# Altium footprint library 全库.PcbLib: 967 footprints (part 38 of 61)
Each footprint in its own frame and in the unit in brackets; x right, y up, seen from the top. Pads: shape width x height; smd on the part's side, far side on the other; paste and mask are expansions set on the pad; w line width, h text height; cw(c..) or ccw(c..) is an arc to the next point about the centre after c.
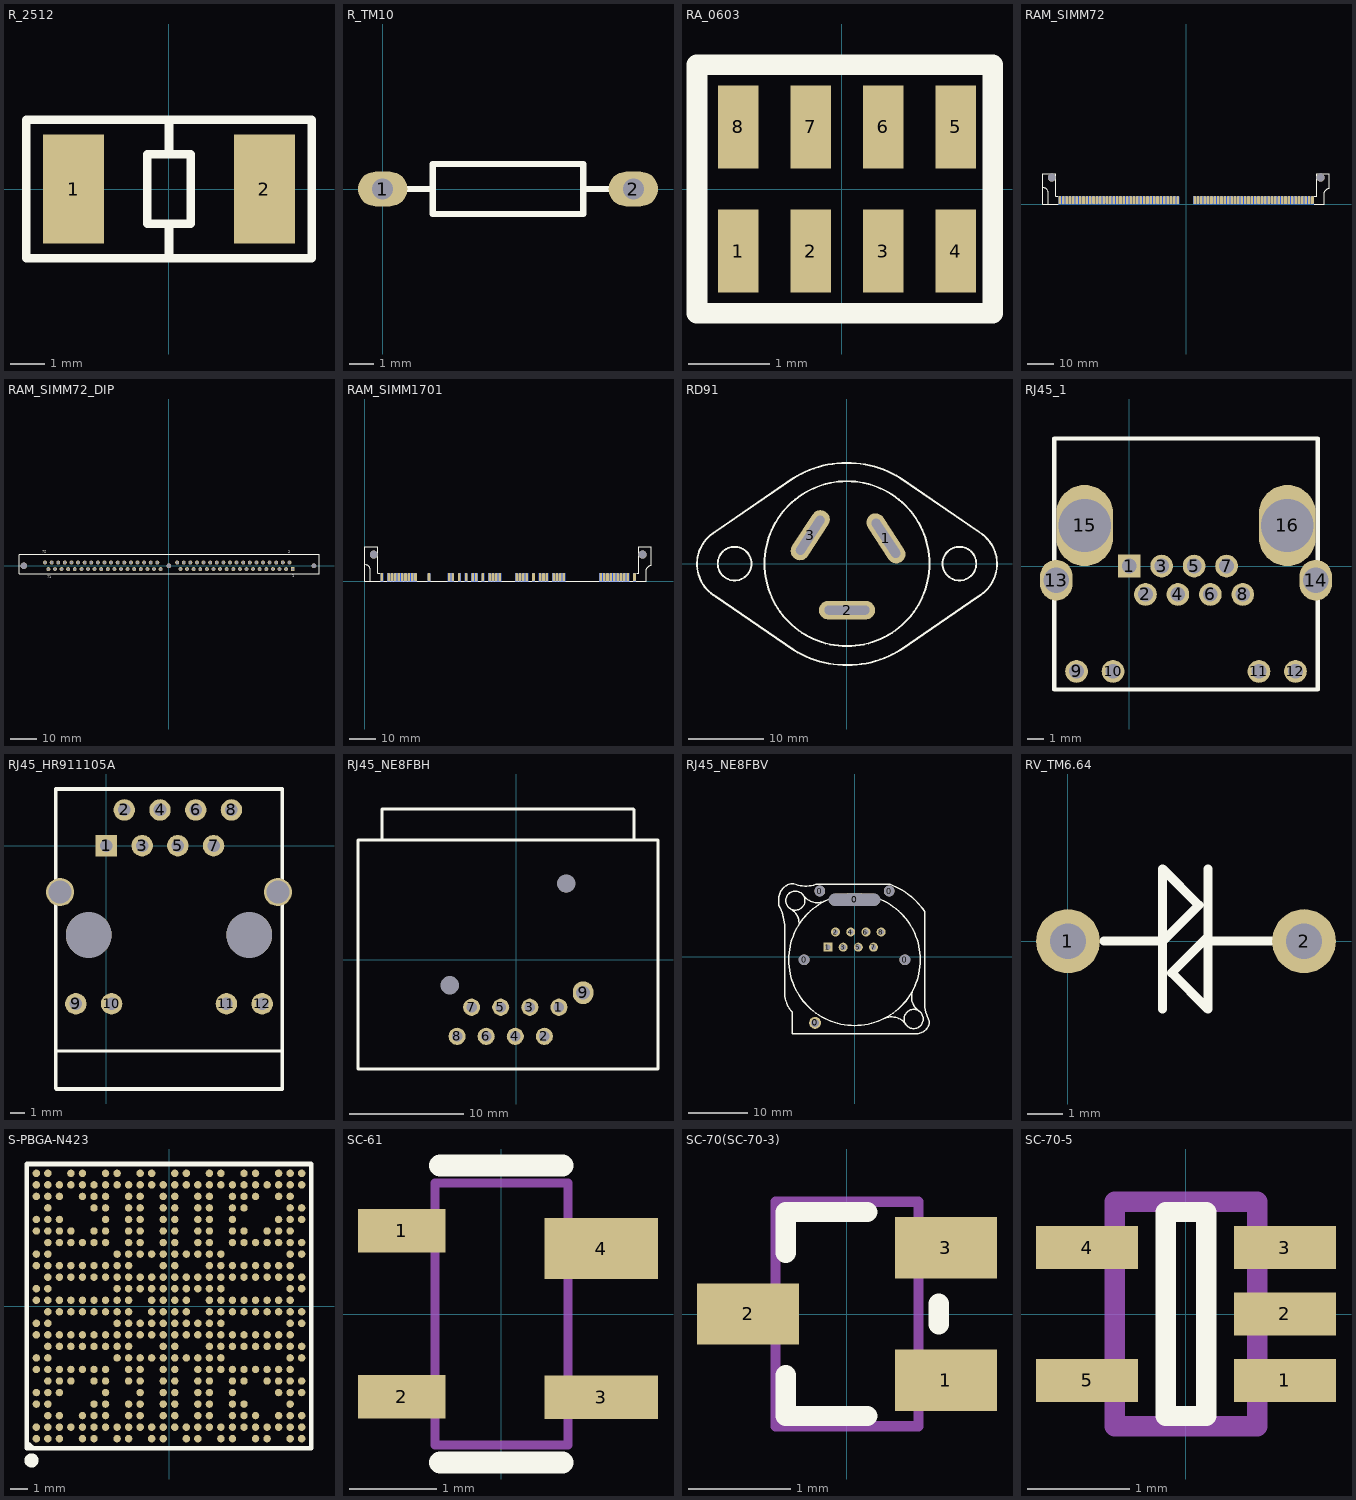
[diagram p37: the footprints below, top view; thin cyan lines are the x and y axes]

## R_2512 [mm] "Chip Resistor; Body 6.3 x 3.2 mm (LxW typ)"
height 0.6
pads (2):
  rect 1.8x3.2 smd: 1(-2.8,0) 2(2.8,0)
Top Overlay:
  lines w0.254: 0,-2.032 0,-1.016 ; 0,1.016 0,2.032 ; -4.191,-2.032 -4.191,2.032 4.191,2.032 4.191,-2.032 -4.191,-2.032 ; -0.635,-1.016 -0.635,1.016 0.635,1.016 0.635,-1.016 -0.635,-1.016

## R_TM10 [mm]
pads (2):
  oval 2x1.4 hole 0.85: 1(0,0) 2(10.16,0)
Top Overlay:
  lines w0.254: 1.016,0 2.032,0 ; 8.128,0 9.144,0 ; 2.032,-1.016 2.032,1.016 8.128,1.016 8.128,-1.016 2.032,-1.016

## RA_0603 [mil]
pads (8):
  rect 19.68x40 smd: 1(-50,-30) 2(-15,-30) 3(20,-30) 4(55,-30) 5(55,30) 6(20,30) 7(-15,30) 8(-50,30)
Top Overlay:
  lines w10: 71.01,-60 -69.99,-60 -69.99,60 73.01,60 73.01,-60

## RAM_SIMM72 [mm]
pads (146):
  rrect50% 1x3 smd: 1(47.636,1.538) 2(46.366,1.538) 3(45.096,1.538) 4(43.826,1.538) 5(42.556,1.538) 6(41.286,1.538) 7(40.016,1.538) 8(38.746,1.538) 9(37.476,1.538) 10(36.206,1.538) 11(34.936,1.538) 12(33.666,1.538) 13(32.396,1.538) 14(31.126,1.538) 15(29.856,1.538) 16(28.586,1.538) 17(27.316,1.538) 18(26.046,1.538) 19(24.776,1.538) 20(23.506,1.538) 21(22.236,1.538) 22(20.966,1.538) 23(19.696,1.538) 24(18.426,1.538) 25(17.156,1.538) 26(15.886,1.538) 27(14.616,1.538) 28(13.346,1.538) 29(12.076,1.538) 30(10.806,1.538) 31(9.536,1.538) 32(8.266,1.538) 33(6.996,1.538) 34(5.726,1.538) 35(4.456,1.538) 36(3.186,1.538) 37(-3.164,1.538) 38(-4.434,1.538) 39(-5.704,1.538) 40(-6.974,1.538) 41(-8.244,1.538) 42(-9.514,1.538) 43(-10.784,1.538) 44(-12.054,1.538) 45(-13.324,1.538) 46(-14.594,1.538) 47(-15.864,1.538) 48(-17.134,1.538) 49(-18.404,1.538) 50(-19.674,1.538) 51(-20.944,1.538) 52(-22.214,1.538) 53(-23.484,1.538) 54(-24.754,1.538) 55(-26.024,1.538) 56(-27.294,1.538) 57(-28.564,1.538) 58(-29.834,1.538) 59(-31.104,1.538) 60(-32.374,1.538) 61(-33.644,1.538) 62(-34.914,1.538) 63(-36.184,1.538) 64(-37.454,1.538) 65(-38.724,1.538) 66(-39.994,1.538) 67(-41.264,1.538) 68(-42.534,1.538) 69(-43.804,1.538) 70(-45.074,1.538) 71(-46.344,1.538) 72(-47.614,1.538)
  rrect50% 1x3 smd far side: 1(47.636,1.538) 2(46.366,1.538) 3(45.096,1.538) 4(43.826,1.538) 5(42.556,1.538) 6(41.286,1.538) 7(40.016,1.538) 8(38.746,1.538) 9(37.476,1.538) 10(36.206,1.538) 11(34.936,1.538) 12(33.666,1.538) 13(32.396,1.538) 14(31.126,1.538) 15(29.856,1.538) 16(28.586,1.538) 17(27.316,1.538) 18(26.046,1.538) 19(24.776,1.538) 20(23.506,1.538) 21(22.236,1.538) 22(20.966,1.538) 23(19.696,1.538) 24(18.426,1.538) 25(17.156,1.538) 26(15.886,1.538) 27(14.616,1.538) 28(13.346,1.538) 29(12.076,1.538) 30(10.806,1.538) 31(9.536,1.538) 32(8.266,1.538) 33(6.996,1.538) 34(5.726,1.538) 35(4.456,1.538) 36(3.186,1.538) 37(-3.164,1.538) 38(-4.434,1.538) 39(-5.704,1.538) 40(-6.974,1.538) 41(-8.244,1.538) 42(-9.514,1.538) 43(-10.784,1.538) 44(-12.054,1.538) 45(-13.324,1.538) 46(-14.594,1.538) 47(-15.864,1.538) 48(-17.134,1.538) 49(-18.404,1.538) 50(-19.674,1.538) 51(-20.944,1.538) 52(-22.214,1.538) 53(-23.484,1.538) 54(-24.754,1.538) 55(-26.024,1.538) 56(-27.294,1.538) 57(-28.564,1.538) 58(-29.834,1.538) 59(-31.104,1.538) 60(-32.374,1.538) 61(-33.644,1.538) 62(-34.914,1.538) 63(-36.184,1.538) 64(-37.454,1.538) 65(-38.724,1.538) 66(-39.994,1.538) 67(-41.264,1.538) 68(-42.534,1.538) 69(-43.804,1.538) 70(-45.074,1.538) 71(-46.344,1.538) 72(-47.614,1.538)
  round 3 hole 3: ""(-50.689,10.038) ""(50.711,10.038)
Top Overlay:
  lines w0.254: -53.993,6.303 cw(c-54.286,3.979) -51.989,4.438 -51.989,0.638 -51.989,-0.062 ; -48.2,-0.062 -53.989,-0.062 -53.989,4.738 -53.989,11.43 -49.089,11.43 -49.089,3.038 -48.189,3.038 ; 48.3,-0.062 52.011,-0.062 52.011,0.638 52.011,4.438 cw(c54.178,3.547) 54.008,5.884 ; 48.3,3.038 49.211,3.038 49.211,11.557 54.011,11.557 54.011,5.938

## RAM_SIMM72_DIP [mm] "SIMM SOKET PITCH 1.27mm"
pads (75):
  rect 1.524x1.524 hole 1: 1(47.625,-1.275)
  round 1.524 hole 1: 2(46.345,1.265) 3(45.085,-1.275) 4(43.815,1.275) 5(42.545,-1.275) 6(41.275,1.265) 7(40.005,-1.275) 8(38.735,1.265) 9(37.465,-1.275) 10(36.195,1.265) 11(34.925,-1.275) 12(33.655,1.265) 13(32.385,-1.275) 14(31.115,1.265) 15(29.845,-1.275) 16(28.575,1.265) 17(27.305,-1.275) 18(26.035,1.265) 19(24.765,-1.275) 20(23.495,1.265) 21(22.225,-1.275) 22(20.955,1.265) 23(19.685,-1.275) 24(18.415,1.265) 25(17.145,-1.275) 26(15.875,1.265) 27(14.605,-1.275) 28(13.335,1.265) 29(12.065,-1.275) 30(10.795,1.27) 31(9.525,-1.275) 32(8.255,1.265) 33(6.985,-1.275) 34(5.715,1.265) 35(4.445,-1.265) 36(3.175,1.265) 37(-3.175,-1.275) 38(-4.445,1.265) 39(-5.715,-1.275) 40(-6.985,1.265) 41(-8.255,-1.275) 42(-9.525,1.265) 43(-10.795,-1.275) 44(-12.065,1.265) 45(-13.335,-1.275) 46(-14.605,1.265) 47(-15.875,-1.275) 48(-17.145,1.265) 49(-18.415,-1.275) 50(-19.685,1.265) 51(-20.955,-1.275) 52(-22.225,1.265) 53(-23.495,-1.275) 54(-24.765,1.265) 55(-26.035,-1.275) 56(-27.305,1.265) 57(-28.575,-1.275) 58(-29.845,1.265) 59(-31.115,-1.275) 60(-32.385,1.265) 61(-33.575,-1.275) 62(-34.925,1.265) 64(-37.465,1.265) 66(-40.005,1.265) 67(-41.275,-1.275) 68(-42.545,1.265) 69(-43.815,-1.275) 70(-45.085,1.265) 71(-46.355,-1.275) 72(-47.625,1.265)
  round 1.524 hole 1 paste+0: 63(-36.195,-1.275) 65(-38.735,-1.275)
  round 2.5 hole 2.5: ""(-55.78,-0.005)
  round 1.8 hole 1.8: ""(0,-0.005) ""(55.78,-0.005)
Top Overlay:
  lines w0.254: -57.64,-2.99 -57.64,4.325 ; -57.64,4.345 57.725,4.345 57.725,-2.995 ; -57.625,-3.005 53.065,-3.005 57.725,-3.005
  text "1" at 47.498,-4.318 h1
  text "2" at 45.974,4.826 h1
  text "72" at -48.641,5.08 h1
  text "71" at -46.863,-4.699 h1

## RAM_SIMM1701 [mm]
pads (126):
  rrect50% 1x3 smd: 1(101.625,1.65) 3(99.085,1.65) 4(97.815,1.65) 5(96.545,1.65) 6(95.275,1.65) 7(94.005,1.65) 8(92.735,1.65) 9(91.465,1.65) 10(90.195,1.65) 11(88.925,1.65) 22(74.955,1.65) 23(73.685,1.65) 24(72.415,1.65) 25(71.145,1.65) 27(68.605,1.65) 28(67.335,1.65) 29(66.065,1.65) 31(63.525,1.65) 33(60.985,1.65) 34(59.715,1.65) 35(58.445,1.65) 36(57.175,1.65) 37(50.825,1.65) 38(49.555,1.65) 39(48.285,1.65) 40(47.015,1.65) 42(44.475,1.65) 44(41.935,1.65) 45(40.665,1.65) 47(38.125,1.65) 49(35.585,1.65) 51(33.045,1.65) 52(31.775,1.65) 58(24.155,1.65) 62(19.075,1.65) 63(17.805,1.65) 64(16.535,1.65) 65(15.265,1.65) 66(13.995,1.65) 67(12.725,1.65) 68(11.455,1.65) 69(10.185,1.65) 70(8.915,1.65) 72(6.375,1.65)
  rrect0% 1x3 smd far side: 1(101.625,1.65) 3(99.085,1.65) 4(97.815,1.65) 5(96.545,1.65) 6(95.275,1.65) 7(94.005,1.65) 8(92.735,1.65) 9(91.465,1.65) 10(90.195,1.65) 11(88.925,1.65) 22(74.955,1.65) 23(73.685,1.65) 24(72.415,1.65) 25(71.145,1.65) 27(68.605,1.65) 28(67.335,1.65) 29(66.065,1.65) 31(63.525,1.65) 33(60.985,1.65) 34(59.715,1.65) 35(58.445,1.65) 36(57.175,1.65) 37(50.825,1.65) 38(49.555,1.65) 39(48.285,1.65) 40(47.015,1.65) 42(44.475,1.65) 44(41.935,1.65) 45(40.665,1.65) 47(38.125,1.65) 49(35.585,1.65) 51(33.045,1.65) 52(31.775,1.65) 58(24.155,1.65) 62(19.075,1.65) 63(17.805,1.65) 64(16.535,1.65) 65(15.265,1.65) 66(13.995,1.65) 67(12.725,1.65) 68(11.455,1.65) 69(10.185,1.65) 70(8.915,1.65) 72(6.375,1.65)
  rrect50% 0x0 smd: 2(100.355,1.65) 12(87.655,1.65) 13(86.385,1.65) 14(85.115,1.65) 15(83.845,1.65) 16(82.575,1.65) 17(81.305,1.65) 18(80.035,1.65) 19(78.765,1.65) 20(77.495,1.65) 21(76.225,1.65) 26(69.875,1.65) 30(64.795,1.65) 32(62.255,1.65) 41(45.745,1.65) 43(43.205,1.65) 46(39.395,1.65) 48(36.855,1.65) 50(34.315,1.65) 53(30.505,1.65) 54(29.235,1.65) 55(27.965,1.65) 56(26.695,1.65) 57(25.425,1.65) 59(22.885,1.65) 60(21.615,1.65) 61(20.345,1.65) 71(7.645,1.65)
  rrect0% 0x0 smd far side: 54(29.235,1.65) 55(27.965,1.65) 56(26.695,1.65) 57(25.425,1.65) 59(22.885,1.65) 60(21.615,1.65) 61(20.345,1.65) 71(7.645,1.65)
  round 3 hole 3: ""(3.3,10.15) ""(104.7,10.15)
Top Overlay:
  lines w0.1: -0.004,6.415 cw(c-0.297,4.091) 2,4.55 ; 106,4.55 cw(c108.166,3.659) 107.997,5.995
  lines w0.254: 2,0.05 2,0.75 2,4.55 ; 5.8,3.15 4.9,3.15 4.9,10.15 4.9,13.15 0.3,13.15 0,13.15 0,4.85 0,0.05 3.5,0.05 98.9,0.05 ; 98.8,0.05 106,0.05 106,0.75 106,4.55 ; 102.5,3.15 103.2,3.15 103.2,10.15 103.2,13.05 103.3,13.15 104.7,13.15 ; 104.6,13.15 108,13.15 108,6.05

## RD91 [mm]
pads (3):
  oval 7.5x2.5 hole 1.2 slot 6 at 123 deg rot 123: 1(5.2,3.38)
  oval 7.5x2.5 hole 1.2 slot 6 at 0 deg: 2(0,-6.2)
  oval 7.5x2.5 hole 1.2 slot 6 at 57 deg rot 57: 3(-4.9,3.8)
Top Overlay:
  circle w0.254: c15,0 r2.25
  circle w0.254: c-15,0 r2.25
  circle w0.254: c0,0 r11
  lines w0.254: -17.599,4.245 ccw(c-15,-0.043) -17.502,-4.389 -7.123,-11.514 ccw(c0,-0.043) 7.234,-11.444 17.522,-4.378 ccw(c15,-0.043) 17.56,4.268 7.123,11.427 ccw(c0,-0.043) -7.234,11.357 -17.599,4.245

## RJ45_1 [mil]
pads (16):
  rect 56x56 hole 36: 1(0,0)
  round 56 hole 36: 2(40,-70) 3(80,0) 4(120,-70) 5(160,0) 6(200,-70) 7(240,0) 8(280,-70) 9(-130,-260) 10(-40,-260) 11(320,-260) 12(410,-260)
  oval 80x100 hole 63: 13(-180,-35) 14(460,-35)
  oval 140x200 hole 130: 15(-110,100) 16(390,100)
Top Overlay:
  lines w10: -185,-305 465,-305 465,315 -185,315 -185,-305

## RJ45_HR911105A [mm]
pads (16):
  rect 1.524x1.524 hole 0.89: 1(0,0)
  round 1.524 hole 0.89: 2(1.27,2.54) 3(2.54,0) 4(3.81,2.54) 5(5.08,0) 6(6.35,2.54) 7(7.62,0) 8(8.89,2.54) 9(-2.175,-11.25) 10(0.365,-11.25) 11(8.535,-11.25) 12(11.075,-11.25)
  round 2 hole 1.63: ""(-3.295,-3.3) ""(12.195,-3.3)
  round 3.25 hole 3.25: ""(-1.265,-6.35) ""(10.165,-6.35)
Top Overlay:
  lines w0.2: -3.6,-14.605 12.5,-14.605
  lines w0.254: 12.5,-17.309 -3.561,-17.309 -3.6,-17.27 -3.6,-12.058 -3.6,4.03 12.5,4.03 12.5,-17.27

## RJ45_NE8FBH [mm] "neutrik 网络插座"
pads (11):
  round 1.5 hole 0.9: 1(3.705,-4.13) 2(2.435,-6.67) 3(1.165,-4.13) 4(-0.105,-6.67) 5(-1.375,-4.13) 6(-2.645,-6.67) 7(-3.915,-4.13) 8(-5.185,-6.67)
  oval 1.8x2 hole 1.2: 9(5.82,-2.86)
  round 1.55 hole 1.6 unplated: ""(-5.82,-2.22) ""(4.34,6.67)
Top Overlay:
  lines w0.254: -11.74,10.48 -11.74,13.18 ; -11.64,13.18 10.21,13.18 10.26,13.13 10.26,12.03 ; -4.09,10.48 -13.84,10.48 -13.84,-9.52 12.36,-9.52 12.36,10.43 ; -4.08,10.48 -0.74,10.48 6.85,10.48 ; 6.86,10.48 12.36,10.48 ; 10.26,10.48 10.26,12.08

## RJ45_NE8FBV [mm] "neutrik 网络插座"
pads (14):
  round 1.8 hole 1.8: 0(-8.425,-0.475) 0(-5.8,11.025) 0(5.8,11.025) 0(8.425,-0.475)
  round 2 hole 1.3: 0(-6.6,-11.025)
  oval 8.6x2 hole 2 slot 8.6 at 0 deg: 0(0,9.575)
  rect 1.5x1.5 hole 0.9: 1(-4.44,1.635)
  round 1.5 hole 0.9: 2(-3.17,4.175) 3(-1.9,1.635) 4(-0.63,4.175) 5(0.64,1.635) 6(1.91,4.175) 7(3.18,1.635) 8(4.45,4.175)
Top Overlay:
  circle w0.254: c0,-0.475 r11
  circle w0.254: c-9.9,9.425 r1.6
  circle w0.254: c9.9,-10.375 r1.6
  lines w0.254: -12.66,8.576 -12.66,9.76 cw(c-10.16,9.76) -10.16,12.26 ccw(c-8.17,16.847) -6.489,12.138 5.942,12.138 cw(c1.784,0.882) 11.73,7.595 11.73,-7.681 ccw(c17.781,-7.681) 12.526,-10.681 cw(c10.367,-10.681) 10.163,-12.831 -10.434,-12.831 ; -12.648,8.576 cw(c-19.013,4.942) -11.684,4.942 -11.684,-5.901 ccw(c-6.684,-5.901) -10.434,-9.208 -10.434,-12.833 ; -10.823,8.13 cw(c-12.162,5.546) -9.254,5.443 ; -8.661,10.447 ccw(c-6.19,11.984) -4.851,9.401 ; 4.846,-10.344 cw(c6.186,-12.928) 8.56,-11.245 ; 9.881,-5.301 ccw(c12.454,-6.66) 10.924,-9.136

## RV_TM6.64 [mm]
pads (2):
  round 1.8 hole 1: 1(0,0) 2(6.64,0)
Top Overlay:
  lines w0.254: 1.016,0 2.662,0 ; 2.665,-1.905 2.665,-0.002 ; 3.681,1.016 2.665,2.032 2.665,-0.002 ; 3.682,1.015 2.665,-0.002 ; 3.935,0 5.715,0 ; 3.935,0.125 2.919,-0.891 3.935,-1.907 3.935,2.032

## S-PBGA-N423 [mm]
pads (424):
  round 0.42 smd mask+0.051: A1(-7.475,-7.475) A2(-7.475,-6.825) A4(-7.475,-5.525) A5(-7.475,-4.875) A7(-7.475,-3.575) A8(-7.475,-2.925) A10(-7.475,-1.625) A11(-7.475,-0.975) A13(-7.475,0.325) A14(-7.475,0.975) A16(-7.475,2.275) A17(-7.475,2.925) A19(-7.475,4.225) A20(-7.475,4.875) A22(-7.475,6.175) A23(-7.475,6.825) A24(-7.475,7.475) AA1(5.525,-7.475) AA2(5.525,-6.825) AA6(5.525,-4.225) AA7(5.525,-3.575) AA9(5.525,-2.275) AA10(5.525,-1.625) AA12(5.525,-0.325) AA13(5.525,0.325) AA15(5.525,1.625) AA16(5.525,2.275) AA18(5.525,3.575) AA19(5.525,4.225) AA23(5.525,6.825) AB2(6.175,-6.825) AB3(6.175,-6.175) AB5(6.175,-4.875) AB6(6.175,-4.225) AB7(6.175,-3.575) AB9(6.175,-2.275) AB10(6.175,-1.625) AB12(6.175,-0.325) AB13(6.175,0.325) AB15(6.175,1.625) AB16(6.175,2.275) AB18(6.175,3.575) AB19(6.175,4.225) AB20(6.175,4.875) AB22(6.175,6.175) AB23(6.175,6.825) AB24(6.175,7.475) AC1(6.825,-7.475) AC2(6.825,-6.825) AC3(6.825,-6.175) AC4(6.825,-5.525) AC5(6.825,-4.875) AC6(6.825,-4.225) AC7(6.825,-3.575) AC8(6.825,-2.925) AC9(6.825,-2.275) AC10(6.825,-1.625) AC11(6.825,-0.975) AC12(6.825,-0.325) AC13(6.825,0.325) AC14(6.825,0.975) AC15(6.825,1.625) AC16(6.825,2.275) AC17(6.825,2.925) AC18(6.825,3.575) AC19(6.825,4.225) AC20(6.825,4.875) AC21(6.825,5.525) AC22(6.825,6.175) AC23(6.825,6.825) AC24(6.825,7.475) AD1(7.475,-7.475) AD2(7.475,-6.825) AD3(7.475,-6.175) AD5(7.475,-4.875) AD6(7.475,-4.225) AD8(7.475,-2.925) AD9(7.475,-2.275) AD11(7.475,-0.975) AD12(7.475,-0.325) AD14(7.475,0.975) AD15(7.475,1.625) AD17(7.475,2.925) AD18(7.475,3.575) AD20(7.475,4.875) AD21(7.475,5.525) AD23(7.475,6.825) AD24(7.475,7.475) B1(-6.825,-7.475) B2(-6.825,-6.825) B3(-6.825,-6.175) B4(-6.825,-5.525) B5(-6.825,-4.875) B6(-6.825,-4.225) B7(-6.825,-3.575) B8(-6.825,-2.925) B9(-6.825,-2.275) B10(-6.825,-1.625) B11(-6.825,-0.975) B12(-6.825,-0.325) B13(-6.825,0.325) B14(-6.825,0.975) B15(-6.825,1.625) B16(-6.825,2.275) B17(-6.825,2.925) B18(-6.825,3.575) B19(-6.825,4.225) B20(-6.825,4.875) B21(-6.825,5.525) B22(-6.825,6.175) B23(-6.825,6.825) B24(-6.825,7.475) C1(-6.175,-7.475) C2(-6.175,-6.825) C3(-6.175,-6.175) C5(-6.175,-4.875) C6(-6.175,-4.225) C7(-6.175,-3.575) C9(-6.175,-2.275) C10(-6.175,-1.625) C12(-6.175,-0.325) C13(-6.175,0.325) C15(-6.175,1.625) C16(-6.175,2.275) C18(-6.175,3.575) C19(-6.175,4.225) C20(-6.175,4.875) C22(-6.175,6.175) C23(-6.175,6.825) D2(-5.525,-6.825) D6(-5.525,-4.225) D7(-5.525,-3.575) D9(-5.525,-2.275) D10(-5.525,-1.625) D12(-5.525,-0.325) D13(-5.525,0.325) D15(-5.525,1.625) D16(-5.525,2.275) D18(-5.525,3.575) D19(-5.525,4.225) D23(-5.525,6.825) D24(-5.525,7.475) E1(-4.875,-7.475) E2(-4.875,-6.825) E3(-4.875,-6.175) E7(-4.875,-3.575) E9(-4.875,-2.275) E10(-4.875,-1.625) E12(-4.875,-0.325) E13(-4.875,0.325) E15(-4.875,1.625) E16(-4.875,2.275) E18(-4.875,3.575) E22(-4.875,6.175) E23(-4.875,6.825) E24(-4.875,7.475) F1(-4.225,-7.475) F2(-4.225,-6.825) F3(-4.225,-6.175) F4(-4.225,-5.525) F6(-4.225,-4.225) F7(-4.225,-3.575) F9(-4.225,-2.275) F10(-4.225,-1.625) F12(-4.225,-0.325) F13(-4.225,0.325) F15(-4.225,1.625) F16(-4.225,2.275) F18(-4.225,3.575) F19(-4.225,4.225) F21(-4.225,5.525) F22(-4.225,6.175) F23(-4.225,6.825) G2(-3.575,-6.825) G3(-3.575,-6.175) G4(-3.575,-5.525) G5(-3.575,-4.875) G6(-3.575,-4.225) G7(-3.575,-3.575) G9(-3.575,-2.275) G10(-3.575,-1.625) G12(-3.575,-0.325) G13(-3.575,0.325) G15(-3.575,1.625) G16(-3.575,2.275) G18(-3.575,3.575) G19(-3.575,4.225) G20(-3.575,4.875) G21(-3.575,5.525) G22(-3.575,6.175) G23(-3.575,6.825) G24(-3.575,7.475) H1(-2.925,-7.475) H2(-2.925,-6.825) H8(-2.925,-2.925) H9(-2.925,-2.275) H10(-2.925,-1.625) H11(-2.925,-0.975) H12(-2.925,-0.325) H13(-2.925,0.325) H14(-2.925,0.975) H15(-2.925,1.625) H16(-2.925,2.275) H17(-2.925,2.925) H23(-2.925,6.825) H24(-2.925,7.475) J1(-2.275,-7.475) J2(-2.275,-6.825) J3(-2.275,-6.175) J4(-2.275,-5.525) J6(-2.275,-4.225) J7(-2.275,-3.575) J8(-2.275,-2.925) J9(-2.275,-2.275) J10(-2.275,-1.625) J11(-2.275,-0.975) J12(-2.275,-0.325) J13(-2.275,0.325) J14(-2.275,0.975) J15(-2.275,1.625) J16(-2.275,2.275) J17(-2.275,2.925) J18(-2.275,3.575) J19(-2.275,4.225) J20(-2.275,4.875) J21(-2.275,5.525) J22(-2.275,6.175) J23(-2.275,6.825) K2(-1.625,-6.825) K3(-1.625,-6.175) K4(-1.625,-5.525) K5(-1.625,-4.875) K6(-1.625,-4.225) K7(-1.625,-3.575) K8(-1.625,-2.925) K10(-1.625,-1.625) K11(-1.625,-0.975) K14(-1.625,0.975) K15(-1.625,1.625) K17(-1.625,2.925) K18(-1.625,3.575) K19(-1.625,4.225) K20(-1.625,4.875) K21(-1.625,5.525) K22(-1.625,6.175) K23(-1.625,6.825) K24(-1.625,7.475) L1(-0.975,-7.475) L2(-0.975,-6.825) L8(-0.975,-2.925) L10(-0.975,-1.625) L11(-0.975,-0.975) L12(-0.975,-0.325) L13(-0.975,0.325) L14(-0.975,0.975) L15(-0.975,1.625) L17(-0.975,2.925) L23(-0.975,6.825) L24(-0.975,7.475) M1(-0.325,-7.475) M2(-0.325,-6.825) M3(-0.325,-6.175) M4(-0.325,-5.525) M5(-0.325,-4.875) M6(-0.325,-4.225) M7(-0.325,-3.575) M8(-0.325,-2.925) M9(-0.325,-2.275) M10(-0.325,-1.625) M11(-0.325,-0.975) M12(-0.325,-0.325) M13(-0.325,0.325) M14(-0.325,0.975) M15(-0.325,1.625) M16(-0.325,2.275) M17(-0.325,2.925) M18(-0.325,3.575) M19(-0.325,4.225) M20(-0.325,4.875) M21(-0.325,5.525) M22(-0.325,6.175) M23(-0.325,6.825) N2(0.325,-6.825) N3(0.325,-6.175) N4(0.325,-5.525) N5(0.325,-4.875) N6(0.325,-4.225) N7(0.325,-3.575) N8(0.325,-2.925) N9(0.325,-2.275) N10(0.325,-1.625) N11(0.325,-0.975) N12(0.325,-0.325) N13(0.325,0.325) N14(0.325,0.975) N15(0.325,1.625) N16(0.325,2.275) N17(0.325,2.925) N18(0.325,3.575) N19(0.325,4.225) N20(0.325,4.875) N21(0.325,5.525) N22(0.325,6.175) N23(0.325,6.825) N24(0.325,7.475) P1(0.975,-7.475) P2(0.975,-6.825) P8(0.975,-2.925) P10(0.975,-1.625) P11(0.975,-0.975) P12(0.975,-0.325) P13(0.975,0.325) P14(0.975,0.975) P15(0.975,1.625) P17(0.975,2.925) P23(0.975,6.825) P24(0.975,7.475) R1(1.625,-7.475) R2(1.625,-6.825) R3(1.625,-6.175) R4(1.625,-5.525) R5(1.625,-4.875) R6(1.625,-4.225) R7(1.625,-3.575) R8(1.625,-2.925) R10(1.625,-1.625) R11(1.625,-0.975) R14(1.625,0.975) R15(1.625,1.625) R17(1.625,2.925) R18(1.625,3.575) R19(1.625,4.225) R20(1.625,4.875) R21(1.625,5.525) R22(1.625,6.175) R23(1.625,6.825) T2(2.275,-6.825) T3(2.275,-6.175) T4(2.275,-5.525) T5(2.275,-4.875) T6(2.275,-4.225) T7(2.275,-3.575) T8(2.275,-2.925) T9(2.275,-2.275) T10(2.275,-1.625) T11(2.275,-0.975) T12(2.275,-0.325) T13(2.275,0.325) T14(2.275,0.975) T15(2.275,1.625) T16(2.275,2.275) T17(2.275,2.925) T18(2.275,3.575) T19(2.275,4.225) T20(2.275,4.875) T21(2.275,5.525) T22(2.275,6.175) T23(2.275,6.825) T24(2.275,7.475) U1(2.925,-7.475) U2(2.925,-6.825) U7(2.925,-3.575) U8(2.925,-2.925) U9(2.925,-2.275) U10(2.925,-1.625) U11(2.925,-0.975) U12(2.925,-0.325) U13(2.925,0.325) U14(2.925,0.975) U15(2.925,1.625) U16(2.925,2.275) U17(2.925,2.925) U23(2.925,6.825) U24(2.925,7.475) V1(3.575,-7.475) V2(3.575,-6.825) V3(3.575,-6.175) V4(3.575,-5.525) V5(3.575,-4.875) V6(3.575,-4.225) V7(3.575,-3.575) V9(3.575,-2.275) V10(3.575,-1.625) V12(3.575,-0.325) V13(3.575,0.325) V15(3.575,1.625) V16(3.575,2.275) V18(3.575,3.575) V19(3.575,4.225) V20(3.575,4.875) V21(3.575,5.525) V22(3.575,6.175) V23(3.575,6.825) W2(4.225,-6.825) W3(4.225,-6.175) W4(4.225,-5.525) W6(4.225,-4.225) W7(4.225,-3.575) W9(4.225,-2.275) W10(4.225,-1.625) W12(4.225,-0.325) W13(4.225,0.325) W15(4.225,1.625) W16(4.225,2.275) W18(4.225,3.575) W19(4.225,4.225) W21(4.225,5.525) W22(4.225,6.175) W23(4.225,6.825) W24(4.225,7.475) Y1(4.875,-7.475) Y2(4.875,-6.825) Y3(4.875,-6.175) Y7(4.875,-3.575) Y9(4.875,-2.275) Y10(4.875,-1.625) Y12(4.875,-0.325) Y13(4.875,0.325) Y15(4.875,1.625) Y16(4.875,2.275) Y18(4.875,3.575) Y22(4.875,6.175) Y23(4.875,6.825) Y24(4.875,7.475)
Top Overlay:
  circle w0.4: c-7.75,-8.7 r0.2
  lines w0.2: -7.975,-7.675 -7.625,-8
  lines w0.254: -8,-8 -8,8 8,8 8,-8 -8,-8

## SC-61 [mm]
pads (4):
  rect 1x0.5 smd: 1(-1.143,0.953) 2(-1.143,-0.947)
  rect 1.3x0.5 smd: 3(1.143,-0.953)
  rect 1.3x0.7 smd: 4(1.143,0.75)
Top Overlay:
  lines w0.254: -0.7,-1.7 0.7,-1.7 ; -0.7,1.7 0.7,1.7
Mechanical 13:
  lines w0.1: -0.762,-1.5 0.762,-1.5 0.762,1.5 -0.762,1.5 -0.762,-1.5

## SC-70(SC-70-3) [mm]
pads (3):
  rect 1x0.6 smd: 1(0.97,-0.65) 2(-0.97,0) 3(0.97,0.65)
Top Overlay:
  lines w0.2: -0.6,-0.6 -0.6,-1 0.2,-1 ; -0.6,0.6 -0.6,1 0.2,1 ; 0.9,-0.1 0.9,0.1
Mechanical 13:
  lines w0.1: -0.7,-1.1 0.7,-1.1 0.7,1.1 -0.7,1.1 -0.7,-1.1
3D body "User Library-SOT323 (SC70-3)-1.STEP": height 1.1, standoff 0, extent -1.123,-1.1 1.122,1.1

## SC-70-5 [mm]
pads (5):
  rect 1x0.42 smd mask+0.051: 1(0.97,-0.65) 2(0.97,0) 3(0.97,0.65) 4(-0.97,0.65) 5(-0.97,-0.65)
Top Overlay:
  lines w0.2: -0.2,-1 0.2,-1 0.2,1 -0.2,1 -0.2,-1
Mechanical 13:
  lines w0.2: -0.7,-1.1 -0.7,1.1 0.7,1.1 0.7,-1.1 -0.7,-1.1
3D body "User Library-SOT353-1.STEP": height 1.1, standoff 0, extent -1.2,-1.1 1.2,1.1